# Altium schematic symbol library AliPadash.SchLib: 1186 symbols (part 1 of 6)
Pins are listed as number, name and electrical type; pins without a type are passive.

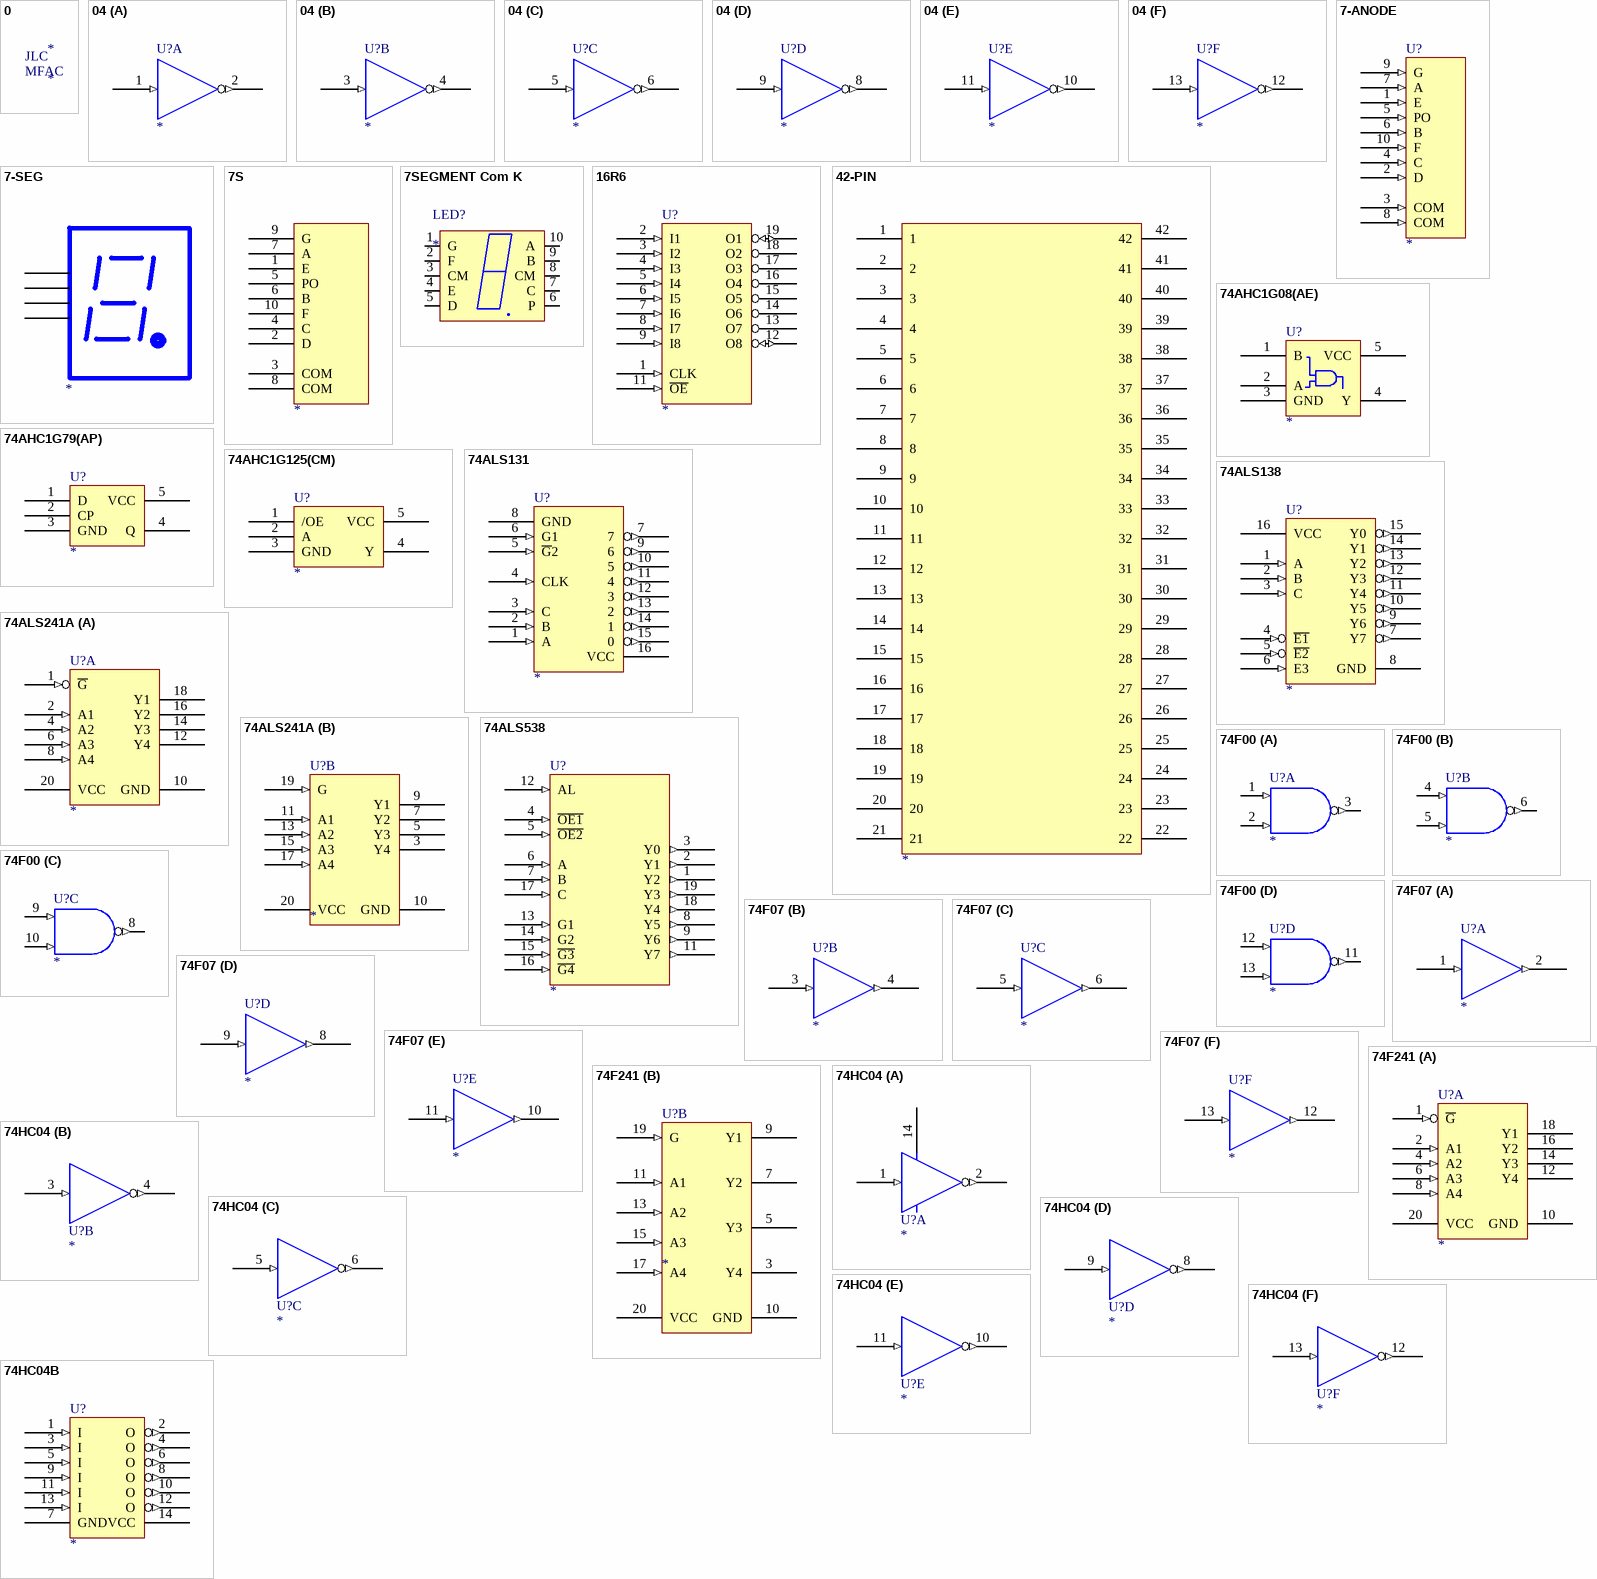
[diagram p0: symbols 0 to 74HC04B]

## 0
designator *
text: JLC; MFAC

## 04
designator U?
footprint SO-14
footprint DIP14
part A pins: 1 I (in), 2 O (out), 7 GND (power) hidden to GND, 14 VCC (power) hidden to VCC
part B pins: 3 I (in), 4 O (out), 7 GND (power) hidden to GND, 14 VCC (power) hidden to VCC
part C pins: 5 I (in), 6 O (out), 7 GND (power) hidden to GND, 14 VCC (power) hidden to VCC
part D pins: 7 GND (power) hidden to GND, 8 O (out), 9 I (in), 14 VCC (power) hidden to VCC
part E pins: 7 GND (power) hidden to GND, 10 O (out), 11 I (in), 14 VCC (power) hidden to VCC
part F pins: 7 GND (power) hidden to GND, 12 O (out), 13 I (in), 14 VCC (power) hidden to VCC
1 alternate drawing of the same symbol

## 7-ANODE
designator U?
pins: 1 E (in), 2 D (in), 3 COM (in), 4 C (in), 5 PO (in), 6 B (in), 7 A (in), 8 COM (in), 9 G (in), 10 F (in)

## 7-SEG
designator ?
pins: ?1, ?2, ?3, ?4

## 7S
designator ?
SS?
pins: 1 E, 2 D, 3 COM, 4 C, 5 PO, 6 B, 7 A, 8 COM, 9 G, 10 F

## 7SEGMENT Com K
designator LED?
ManufacturerName: SM420391N/8; JLCPCB: C252199
footprint 7SEGMENT
pins: 1 G, 2 F, 3 CM, 4 E, 5 D, 6 P, 7 C, 8 CM, 9 B, 10 A

## 16R6
designator U?
footprint DIP20
pins: 1 CLK (in), 2 I1 (in), 3 I2 (in), 4 I3 (in), 5 I4 (in), 6 I5 (in), 7 I6 (in), 8 I7 (in), 9 I8 (in), 10 GND (power) hidden to GND, 11 ~{OE} (in), 12 O8 (io), 13 O7 (hiz), 14 O6 (hiz), 15 O5 (hiz), 16 O4 (hiz), 17 O3 (hiz), 18 O2 (hiz), 19 O1 (io), 20 VCC (power) hidden to VCC

## 42-PIN
designator ?
pins: 1, 2, 3, 4, 5, 6, 7, 8, 9, 10, 11, 12, 13, 14, 15, 16, 17, 18, 19, 20, 21, 22, 23, 24, 25, 26, 27, 28, 29, 30, 31, 32, 33, 34, 35, 36, 37, 38, 39, 40, 41, 42

## 74AHC1G08(AE)
designator U?
footprint SOT353
pins: 1 B, 2 A, 3 GND, 4 Y, 5 VCC

## 74AHC1G79(AP)
designator U?
footprint SOT353
pins: 1 D, 2 CP, 3 GND, 4 Q, 5 VCC

## 74AHC1G125(CM)
designator U?
footprint SOT353
pins: 1 /OE, 2 A, 3 GND, 4 Y, 5 VCC

## 74ALS131
designator U?
footprint DIP16
pins: 1 A (in), 2 B (in), 3 C (in), 4 CLK (in), 5 ~{G}2 (in), 6 G1 (in), 7 (out), 8 GND (power), 9 6 (out), 10 5 (out), 11 4 (out), 12 3 (out), 13 2 (out), 14 1 (out), 15 0 (out), 16 VCC (power)

## 74ALS138
designator U?
footprint DIP16
pins: 1 A (in), 2 B (in), 3 C (in), 4 ~{E1} (in), 5 ~{E2} (in), 6 E3 (in), 7 Y7 (out), 8 GND (power), 9 Y6 (out), 10 Y5 (out), 11 Y4 (out), 12 Y3 (out), 13 Y2 (out), 14 Y1 (out), 15 Y0 (out), 16 VCC (power)

## 74ALS241A
designator U?
OCTAL BUF AND LIN DRV 3SO
footprint DIP20
footprint SOICW20
part A pins: 1 ~{G} (in), 2 A1 (in), 4 A2 (in), 6 A3 (in), 8 A4 (in), 10 GND (power), 12 Y4 (hiz), 14 Y3 (hiz), 16 Y2 (hiz), 18 Y1 (hiz), 20 VCC (power)
part B pins: 3 Y4 (hiz), 5 Y3 (hiz), 7 Y2 (hiz), 9 Y1 (hiz), 10 GND (power), 11 A1 (in), 13 A2 (in), 15 A3 (in), 17 A4 (in), 19 G (in), 20 VCC (power)
1 alternate drawing of the same symbol

## 74ALS538
designator U?
footprint DIP20
pins: 1 Y2 (out), 2 Y1 (out), 3 Y0 (out), 4 ~{OE1} (in), 5 ~{OE2} (in), 6 A (in), 7 B (in), 8 Y5 (out), 9 Y6 (out), 10 GND (power) hidden to GND, 11 Y7 (out), 12 AL (in), 13 G1 (in), 14 G2 (in), 15 ~{G3} (in), 16 ~{G4} (in), 17 C (in), 18 Y4 (out), 19 Y3 (out), 20 VCC (power) hidden to VCC

## 74F00
designator U?
Quad 2-Input Positive-NAND Gate
footprint DIP-14
simulation model 74F00 (SIMCODE)
part A pins: 1 A (in), 2 B (in), 3 Y (out), 7 GND (power) hidden to GND, 14 VCC (power) hidden to VCC
part B pins: 4 A (in), 5 B (in), 6 Y (out), 7 GND (power) hidden to GND, 14 VCC (power) hidden to VCC
part C pins: 7 GND (power) hidden to GND, 8 Y (out), 9 A (in), 10 B (in), 14 VCC (power) hidden to VCC
part D pins: 7 GND (power) hidden to GND, 11 Y (out), 12 A (in), 13 B (in), 14 VCC (power) hidden to VCC
1 alternate drawing of the same symbol

## 74F07
designator U?
footprint SO-14
part A pins: 1 I (in), 2 O (out), 7 GND hidden to GND, 14 VCC hidden to VCC
part B pins: 3 I (in), 4 O (out), 7 GND hidden to GND, 14 VCC hidden to VCC
part C pins: 5 I (in), 6 O (out), 7 GND hidden to GND, 14 VCC hidden to VCC
part D pins: 7 GND hidden to GND, 8 O (out), 9 I (in), 14 VCC hidden to VCC
part E pins: 7 GND hidden to GND, 10 O (out), 11 I (in), 14 VCC hidden to VCC
part F pins: 7 GND hidden to GND, 12 O (out), 13 I (in), 14 VCC hidden to VCC

## 74F241
designator U?
OCTAL BUF AND LIN DRV 3SO
footprint SOICW20
footprint DIP20
part A pins: 1 ~{G} (in), 2 A1 (in), 4 A2 (in), 6 A3 (in), 8 A4 (in), 10 GND (power), 12 Y4 (hiz), 14 Y3 (hiz), 16 Y2 (hiz), 18 Y1 (hiz), 20 VCC (power)
part B pins: 3 Y4 (hiz), 5 Y3 (hiz), 7 Y2 (hiz), 9 Y1 (hiz), 10 GND (power), 11 A1 (in), 13 A2 (in), 15 A3 (in), 17 A4 (in), 19 G (in), 20 VCC (power)
1 alternate drawing of the same symbol

## 74HC04
designator U?
footprint DIP14
part A pins: 1 I (in), 2 O (out), 7 GND (power) hidden to GND, 14 VCC (power)
part B pins: 3 I (in), 4 O (out), 7 GND (power) hidden to GND, 14 VCC (power) hidden to VCC
part C pins: 5 I (in), 6 O (out), 7 GND (power) hidden to GND, 14 VCC (power) hidden to VCC
part D pins: 7 GND (power) hidden to GND, 8 O (out), 9 I (in), 14 VCC (power) hidden to VCC
part E pins: 7 GND (power) hidden to GND, 10 O (out), 11 I (in), 14 VCC (power) hidden to VCC
part F pins: 7 GND (power) hidden to GND, 12 O (out), 13 I (in), 14 VCC (power) hidden to VCC
1 alternate drawing of the same symbol

## 74HC04B
designator U?
footprint SO-14
pins: 1 I (in), 2 O (out), 3 I (in), 4 O (out), 5 I (in), 6 O (out), 7 GND (power), 8 O (out), 9 I (in), 10 O (out), 11 I (in), 12 O (out), 13 I (in), 14 VCC (power)
1 alternate drawing of the same symbol

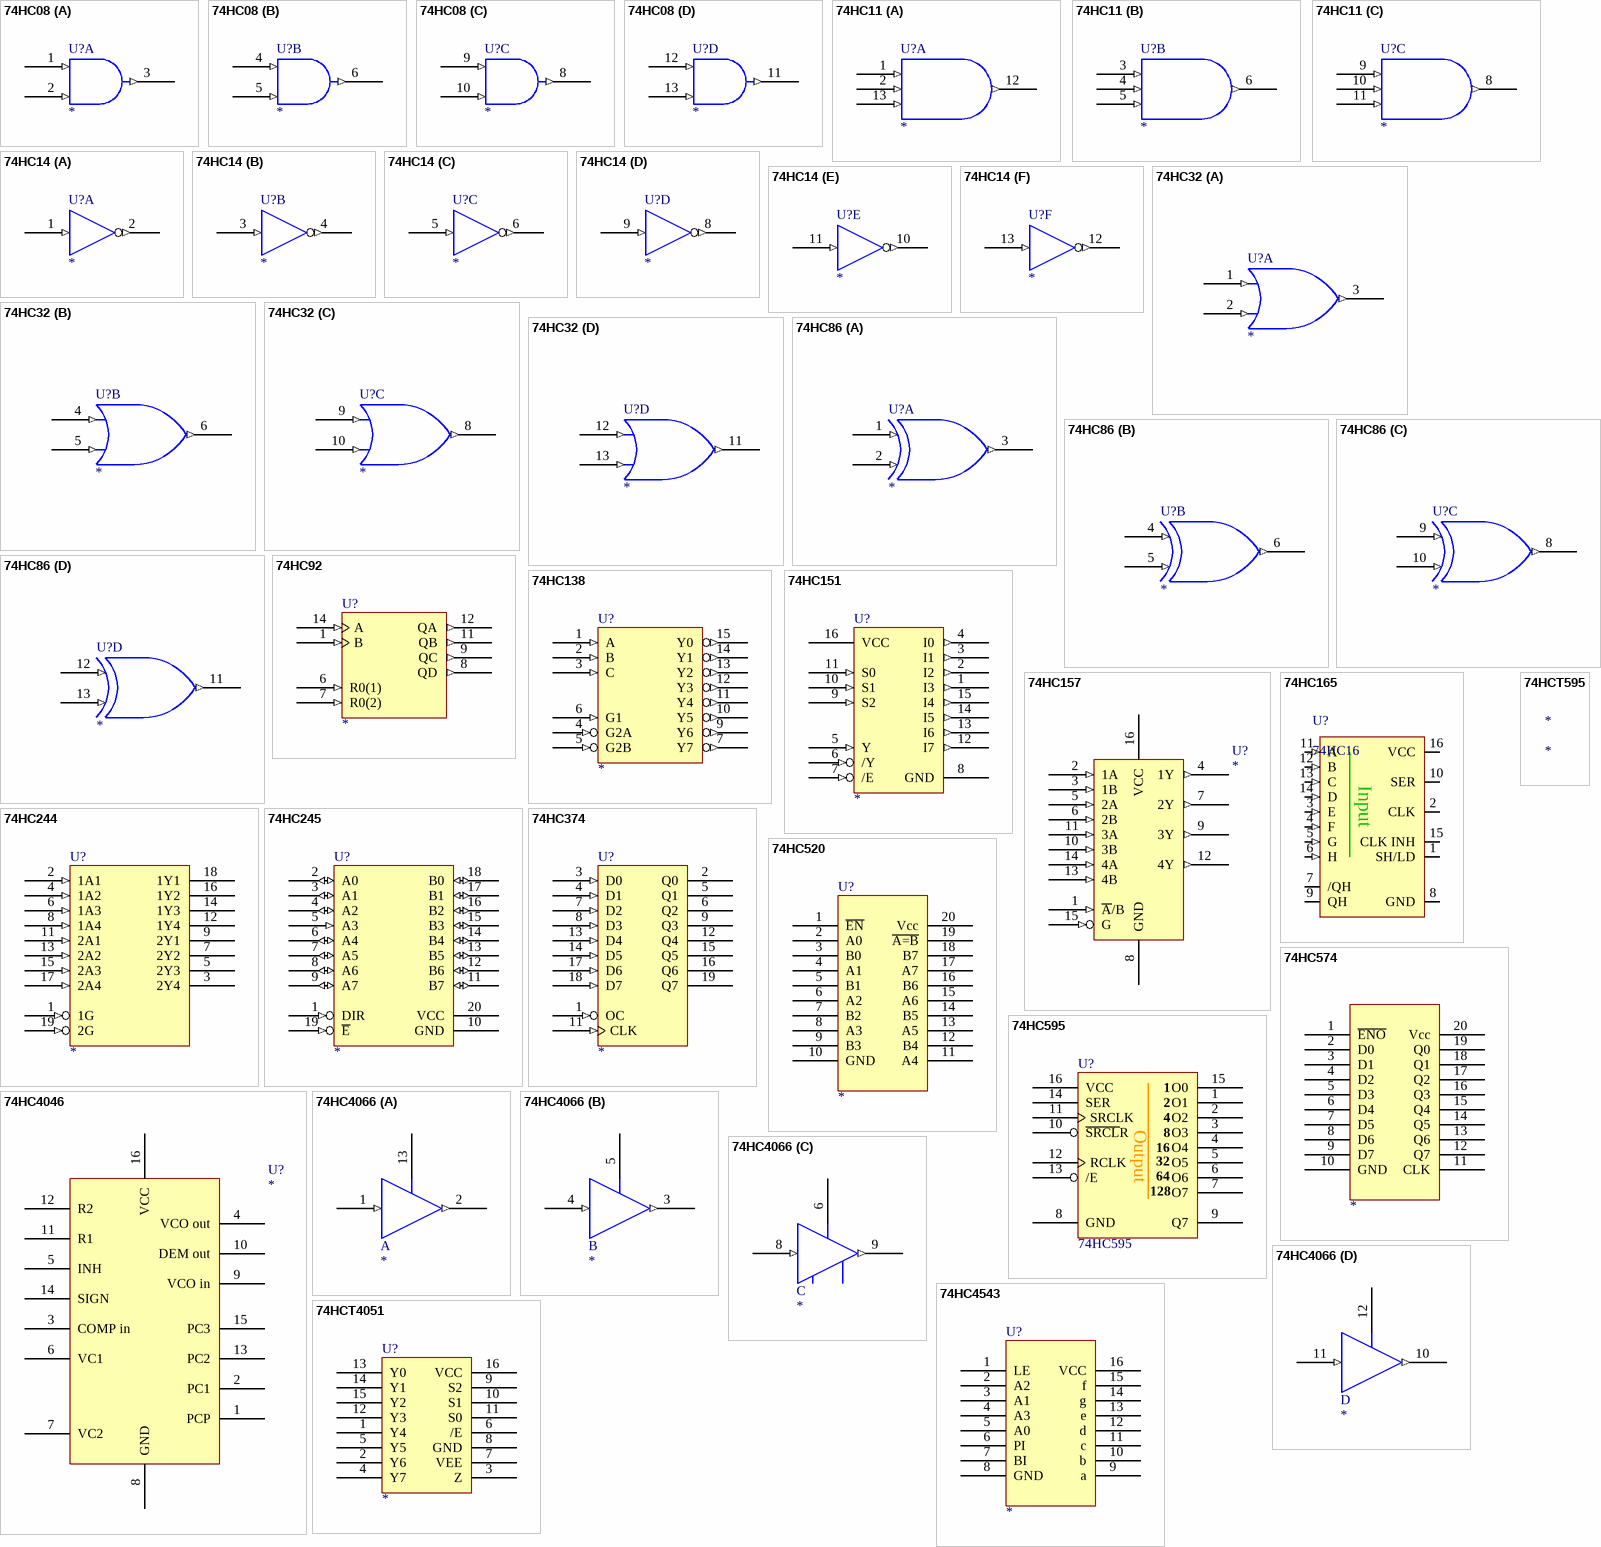
[diagram p1: symbols 74HC08 to 74HCT4051]

## 74HC08
designator U?
part A pins: 1 I0 (in), 2 I1 (in), 3 O (out), 7 GND (power) hidden to GND, 14 VCC (power) hidden to VCC
part B pins: 4 I0 (in), 5 I1 (in), 6 O (out), 7 GND (power) hidden to GND, 14 VCC (power) hidden to VCC
part C pins: 7 GND (power) hidden to GND, 8 O (out), 9 I0 (in), 10 I1 (in), 14 VCC (power) hidden to VCC
part D pins: 7 GND (power) hidden to GND, 11 O (out), 12 I0 (in), 13 I1 (in), 14 VCC (power) hidden to VCC
1 alternate drawing of the same symbol

## 74HC11
designator U?
part A pins: 1 I0 (in), 2 I1 (in), 7 GND (power) hidden to GND, 12 O (out), 13 I2 (in), 14 VCC (power) hidden to VCC
part B pins: 3 I0 (in), 4 I1 (in), 5 I2 (in), 6 O (out), 7 GND (power) hidden to GND, 14 VCC (power) hidden to VCC
part C pins: 7 GND (power) hidden to GND, 8 O (out), 9 I0 (in), 10 I1 (in), 11 I2 (in), 14 VCC (power) hidden to VCC
1 alternate drawing of the same symbol

## 74HC14
designator U?
footprint DIP14
part A pins: 1 I (in), 2 O (out), 7 GND (power) hidden to GND, 14 VCC (power) hidden to VCC
part B pins: 3 I (in), 4 O (out), 7 GND (power) hidden to GND, 14 VCC (power) hidden to VCC
part C pins: 5 I (in), 6 O (out), 7 GND (power) hidden to GND, 14 VCC (power) hidden to VCC
part D pins: 7 GND (power) hidden to GND, 8 O (out), 9 I (in), 14 VCC (power) hidden to VCC
part E pins: 7 GND (power) hidden to GND, 10 O (out), 11 I (in), 14 VCC (power) hidden to VCC
part F pins: 7 GND (power) hidden to GND, 12 O (out), 13 I (in), 14 VCC (power) hidden to VCC
1 alternate drawing of the same symbol

## 74HC32
designator U?
part A pins: 1 I0 (in), 2 I1 (in), 3 O (out), 7 GND (power) hidden to GND, 14 VCC (power) hidden to VCC
part B pins: 4 I0 (in), 5 I1 (in), 6 O (out), 7 GND (power) hidden to GND, 14 VCC (power) hidden to VCC
part C pins: 7 GND (power) hidden to GND, 8 O (out), 9 I0 (in), 10 I1 (in), 14 VCC (power) hidden to VCC
part D pins: 7 GND (power) hidden to GND, 11 O (out), 12 I0 (in), 13 I1 (in), 14 VCC (power) hidden to VCC
1 alternate drawing of the same symbol

## 74HC86
designator U?
part A pins: 1 I0 (in), 2 I1 (in), 3 O (out), 7 GND (power) hidden to GND, 14 VCC (power) hidden to VCC
part B pins: 4 I0 (in), 5 I1 (in), 6 O (out), 7 GND (power) hidden to GND, 14 VCC (power) hidden to VCC
part C pins: 7 GND (power) hidden to GND, 8 O (out), 9 I0 (in), 10 I1 (in), 14 VCC (power) hidden to VCC
part D pins: 7 GND (power) hidden to GND, 11 O (out), 12 I0 (in), 13 I1 (in), 14 VCC (power) hidden to VCC
1 alternate drawing of the same symbol

## 74HC92
designator U?
pins: 1 B (in), 5 VCC (power) hidden to VCC, 6 R0(1) (in), 7 R0(2) (in), 8 QD (out), 9 QC (out), 10 GND (power) hidden to GND, 11 QB (out), 12 QA (out), 14 A (in)

## 74HC138
designator U?
pins: 1 A (in), 2 B (in), 3 C (in), 4 G2A (in), 5 G2B (in), 6 G1 (in), 7 Y7 (out), 8 GND (power) hidden to GND, 9 Y6 (out), 10 Y5 (out), 11 Y4 (out), 12 Y3 (out), 13 Y2 (out), 14 Y1 (out), 15 Y0 (out), 16 VCC (power) hidden to VCC

## 74HC151
designator U?
footprint SO-16
pins: 1 I3 (out), 2 I2 (out), 3 I1 (out), 4 I0 (out), 5 Y (in), 6 /Y (in), 7 /E (in), 8 GND (power), 9 S2 (in), 10 S1 (in), 11 S0 (in), 12 I7 (out), 13 I6 (out), 14 I5 (out), 15 I4 (out), 16 VCC (power)

## 74HC157
designator U?
pins: 1 ~{A}/B (in), 2 1A (in), 3 1B (in), 4 1Y (out), 5 2A (in), 6 2B (in), 7 2Y (out), 8 GND (power), 9 3Y (out), 10 3B (in), 11 3A (in), 12 4Y (out), 13 4B (in), 14 4A (in), 15 G (in), 16 VCC (power)

## 74HC165
designator U?, comment 74HC16
MFC: 74HC165D,653; JLC: C5613
footprint SO-16
pins: 1 SH/LD, 2 CLK, 3 E (in), 4 F (in), 5 G (in), 6 H (in), 7 /QH, 8 GND, 9 QH, 10 SER, 11 A (in), 12 B (in), 13 C (in), 14 D (in), 15 CLK INH, 16 VCC
text: Input

## 74HC244
designator U?
pins: 1 1G (in), 2 1A1 (in), 3 2Y4 (hiz), 4 1A2 (in), 5 2Y3 (hiz), 6 1A3 (in), 7 2Y2 (hiz), 8 1A4 (in), 9 2Y1 (hiz), 10 GND (power) hidden to GND, 11 2A1 (in), 12 1Y4 (hiz), 13 2A2 (in), 14 1Y3 (hiz), 15 2A3 (in), 16 1Y2 (hiz), 17 2A4 (in), 18 1Y1 (hiz), 19 2G (in), 20 VCC (power) hidden to VCC

## 74HC245
designator U?
pins: 1 DIR (in), 2 A0 (io), 3 A1 (io), 4 A2 (io), 5 A3 (in), 6 A4 (io), 7 A5 (io), 8 A6 (io), 9 A7 (io), 10 GND, 11 B7 (io), 12 B6 (io), 13 B5 (io), 14 B4 (io), 15 B3 (io), 16 B2 (io), 17 B1 (io), 18 B0 (io), 19 ~{E} (in), 20 VCC

## 74HC374
designator U?
pins: 1 OC (in), 2 Q0 (hiz), 3 D0 (in), 4 D1 (in), 5 Q1 (hiz), 6 Q2 (hiz), 7 D2 (in), 8 D3 (in), 9 Q3 (hiz), 10 GND (power) hidden to GND, 11 CLK (in), 12 Q4 (hiz), 13 D4 (in), 14 D5 (in), 15 Q5 (hiz), 16 Q6 (hiz), 17 D6 (in), 18 D7 (in), 19 Q7 (hiz), 20 VCC (power) hidden to VCC

## 74HC520
designator U?
pins: 1 ~{EN}, 2 A0, 3 B0, 4 A1, 5 B1, 6 A2, 7 B2, 8 A3, 9 B3, 10 GND, 11 A4, 12 B4, 13 A5, 14 B5, 15 A6, 16 B6, 17 A7, 18 B7, 19 ~{A=B}, 20 Vcc

## 74HC574
designator ?
pins: 1 ~{ENO}, 2 D0, 3 D1, 4 D2, 5 D3, 6 D4, 7 D5, 8 D6, 9 D7, 10 GND, 11 CLK, 12 Q7, 13 Q6, 14 Q5, 15 Q4, 16 Q3, 17 Q2, 18 Q1, 19 Q0, 20 Vcc

## 74HC595
designator U?
MFAC: 74HC595D,118; JLC: C5947
footprint SO-16
pins: 1 O1, 2 O2, 3 O3, 4 O4, 5 O5, 6 O6, 7 O7, 8 GND, 9 Q7, 10 ~{SRCL}R, 11 SRCLK, 12 RCLK, 13 /E, 14 SER, 15 O0, 16 VCC
text: Output; 32; 64; 128

## 74HC4046
designator U?
footprint DIP16
pins: 1 PCP, 2 PC1, 3 COMP in, 4 VCO out, 5 INH, 6 VC1, 7 VC2, 8 GND (power), 9 VCO in, 10 DEM out, 11 R1, 12 R2, 13 PC2, 14 SIGN, 15 PC3, 16 VCC (power)

## 74HC4066
designator ?
part A pins: 1 I (in), 2 O (out), 7 GND hidden to GND, 13 X1, 14 VCC hidden to VCC
part B pins: 3 O (out), 4 I (in), 5, 7 GND hidden to GND, 14 VCC hidden to VCC
part C pins: 6, 7 hidden, 8 (in), 9 (out), 14 hidden
part D pins: 7 GND hidden to GND, 10 O (out), 11 I (in), 12, 14 VCC hidden to VCC

## 74HC4543
designator U?
pins: 1 LE, 2 A2, 3 A1, 4 A3, 5 A0, 6 PI, 7 BI, 8 GND (power), 9 a, 10 b, 11 c, 12 d, 13 e, 14 g, 15 f, 16 VCC (power)

## 74HCT595
designator *

## 74HCT4051
designator U?
footprint SO-16
pins: 1 Y4, 2 Y6, 3 Z, 4 Y7, 5 Y5, 6 /E, 7 VEE, 8 GND, 9 S2, 10 S1, 11 S0, 12 Y3, 13 Y0, 14 Y1, 15 Y2, 16 VCC

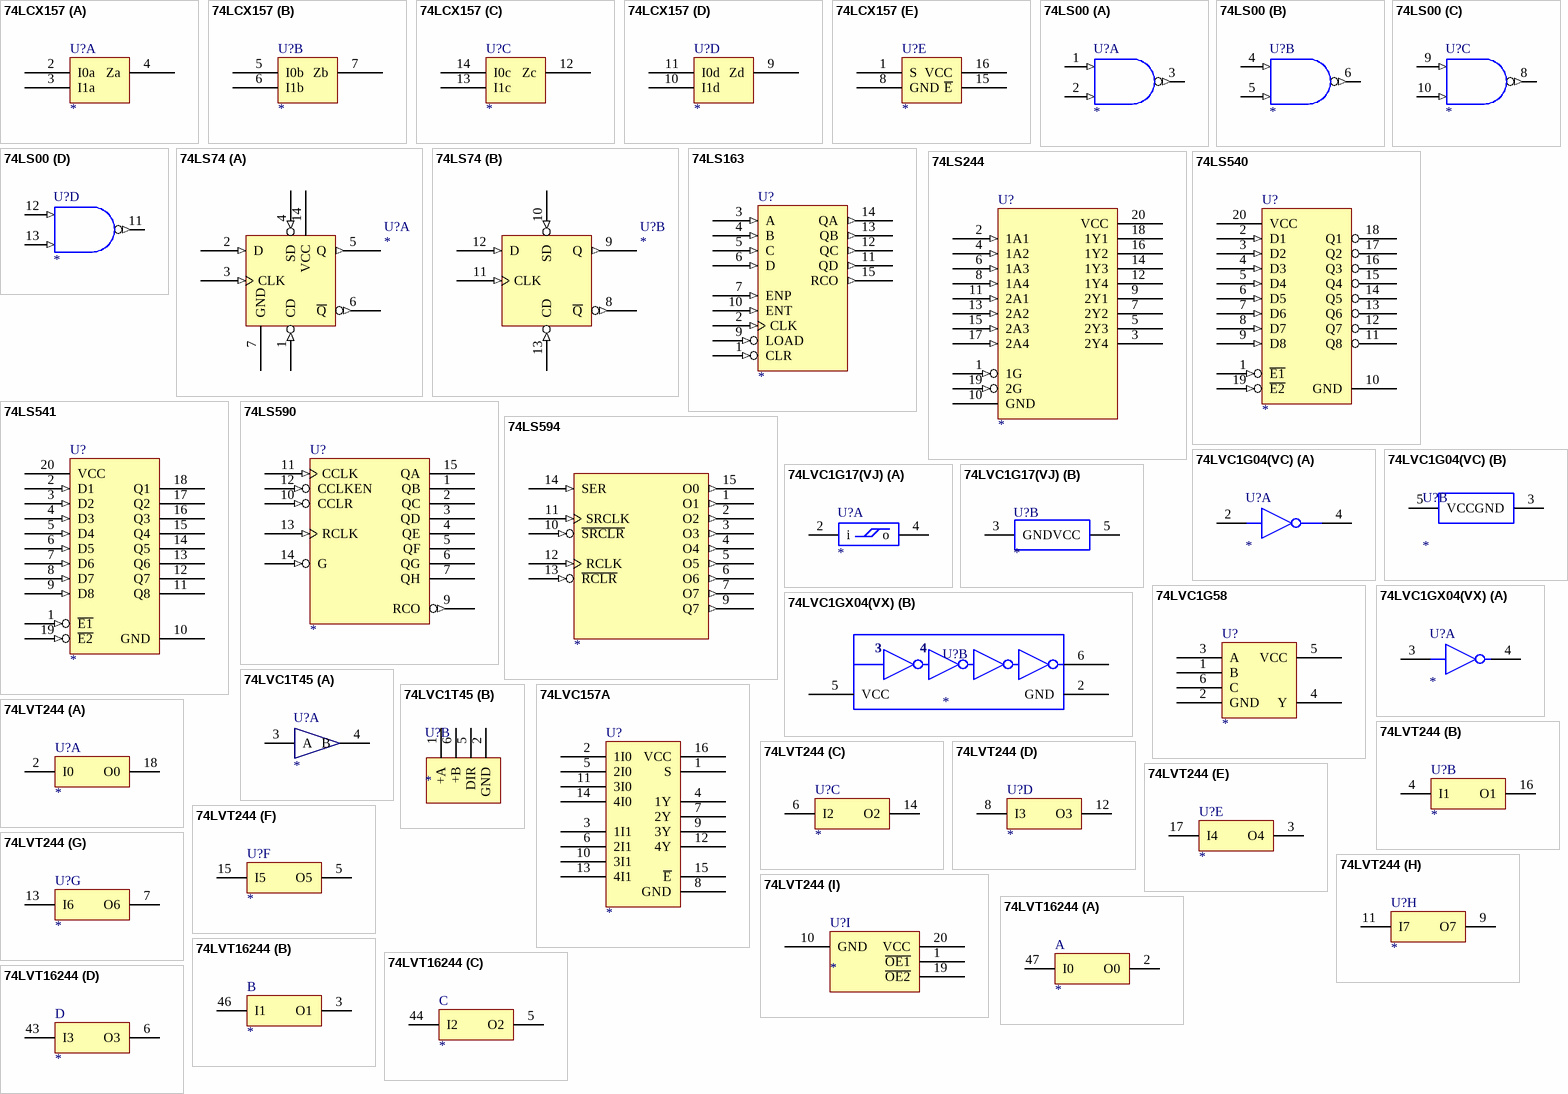
[diagram p2: symbols 74LCX157 to 74LVT16244]

## 74LCX157
designator U?
part A pins: 2 I0a, 3 I1a, 4 Za
part B pins: 5 I0b, 6 I1b, 7 Zb
part C pins: 12 Zc, 13 I1c, 14 I0c
part D pins: 9 Zd, 10 I1d, 11 I0d
part E pins: 1 S, 8 GND, 15 ~{E}, 16 VCC

## 74LS00
designator U?
Quad 2-Input Positive-NAND Gate
footprint DIP-14
simulation model 74LS00 (SIMCODE)
part A pins: 1 A (in), 2 B (in), 3 Y (out), 7 GND (power) hidden to GND, 14 VCC (power) hidden to VCC
part B pins: 4 A (in), 5 B (in), 6 Y (out), 7 GND (power) hidden to GND, 14 VCC (power) hidden to VCC
part C pins: 7 GND (power) hidden to GND, 8 Y (out), 9 A (in), 10 B (in), 14 VCC (power) hidden to VCC
part D pins: 7 GND (power) hidden to GND, 11 Y (out), 12 A (in), 13 B (in), 14 VCC (power) hidden to VCC
1 alternate drawing of the same symbol

## 74LS74
designator U?
footprint DIP14
part A pins: 1 CD (in), 2 D (in), 3 CLK (in), 4 SD (in), 5 Q (out), 6 ~{Q} (out), 7 GND (power), 14 VCC (power)
part B pins: 7 GND (power) hidden to GND, 8 ~{Q} (out), 9 Q (out), 10 SD (in), 11 CLK (in), 12 D (in), 13 CD (in), 14 VCC (power) hidden to VCC

## 74LS163
designator U?
pins: 1 CLR (in), 2 CLK (in), 3 A (in), 4 B (in), 5 C (in), 6 D (in), 7 ENP (in), 8 GND (power) hidden to GND, 9 LOAD (in), 10 ENT (in), 11 QD (out), 12 QC (out), 13 QB (out), 14 QA (out), 15 RCO (out), 16 VCC (power) hidden to VCC

## 74LS244
designator U?
footprint SO-20WB
pins: 1 1G (in), 2 1A1 (in), 3 2Y4 (hiz), 4 1A2 (in), 5 2Y3 (hiz), 6 1A3 (in), 7 2Y2 (hiz), 8 1A4 (in), 9 2Y1 (hiz), 10 GND (power), 11 2A1 (in), 12 1Y4 (hiz), 13 2A2 (in), 14 1Y3 (hiz), 15 2A3 (in), 16 1Y2 (hiz), 17 2A4 (in), 18 1Y1 (hiz), 19 2G (in), 20 VCC (power)

## 74LS540
designator U?
footprint DIP20
pins: 1 ~{E1} (in), 2 D1 (in), 3 D2 (in), 4 D3 (in), 5 D4 (in), 6 D5 (in), 7 D6 (in), 8 D7 (in), 9 D8 (in), 10 GND (power), 11 Q8 (hiz), 12 Q7 (hiz), 13 Q6 (hiz), 14 Q5 (hiz), 15 Q4 (hiz), 16 Q3 (hiz), 17 Q2 (hiz), 18 Q1 (hiz), 19 ~{E2} (in), 20 VCC (power)

## 74LS541
designator U?
footprint DIP20
pins: 1 ~{E1} (in), 2 D1 (in), 3 D2 (in), 4 D3 (in), 5 D4 (in), 6 D5 (in), 7 D6 (in), 8 D7 (in), 9 D8 (in), 10 GND (power), 11 Q8 (hiz), 12 Q7 (hiz), 13 Q6 (hiz), 14 Q5 (hiz), 15 Q4 (hiz), 16 Q3 (hiz), 17 Q2 (hiz), 18 Q1 (hiz), 19 ~{E2} (in), 20 VCC (power)

## 74LS590
designator U?
pins: 1 QB (hiz), 2 QC (hiz), 3 QD (hiz), 4 QE (hiz), 5 QF (hiz), 6 QG (hiz), 7 QH (hiz), 8 GND (power) hidden to GND, 9 RCO (out), 10 CCLR (in), 11 CCLK (in), 12 CCLKEN (in), 13 RCLK (in), 14 G (in), 15 QA (hiz), 16 VCC (power) hidden to VCC

## 74LS594
designator ?
pins: 1 O1 (out), 2 O2 (out), 3 O3 (out), 4 O4 (out), 5 O5 (out), 6 O6 (out), 7 O7 (out), 9 Q7 (out), 10 ~{SRCLR} (in), 11 SRCLK (in), 12 RCLK (in), 13 ~{RCLR} (in), 14 SER (in), 15 O0 (out)

## 74LVC1G04(VC)
designator U?
footprint SOT353
part A pins: 2, 4
part B pins: 3 GND, 5 VCC

## 74LVC1G17(VJ)
designator U?
footprint SOT353
part A pins: 2 i, 4 o
part B pins: 3 GND, 5 VCC

## 74LVC1G58
designator U?
footprint SOT363
pins: 1 B, 2 GND, 3 A, 4 Y, 5 VCC, 6 C

## 74LVC1GX04(VX)
designator U?
footprint SOT363
part A pins: 3, 4
part B pins: 2 GND, 5 VCC, 6

## 74LVC1T45
designator U?
footprint SOT363
part A pins: 3 A, 4 B
part B pins: 1 +A, 2 GND, 5 DIR, 6 +B

## 74LVC157A
designator U?
footprint SO-16
pins: 1 S, 2 1I0, 3 1I1, 4 1Y, 5 2I0, 6 2I1, 7 2Y, 8 GND, 9 3Y, 10 3I1, 11 3I0, 12 4Y, 13 4I1, 14 4I0, 15 ~{E}, 16 VCC

## 74LVT244
designator U?
footprint M20B
part A pins: 2 I0, 18 O0
part B pins: 4 I1, 16 O1
part C pins: 6 I2, 14 O2
part D pins: 8 I3, 12 O3
part E pins: 3 O4, 17 I4
part F pins: 5 O5, 15 I5
part G pins: 7 O6, 13 I6
part H pins: 9 O7, 11 I7
part I pins: 1 ~{OE1}, 10 GND, 19 ~{OE2}, 20 VCC

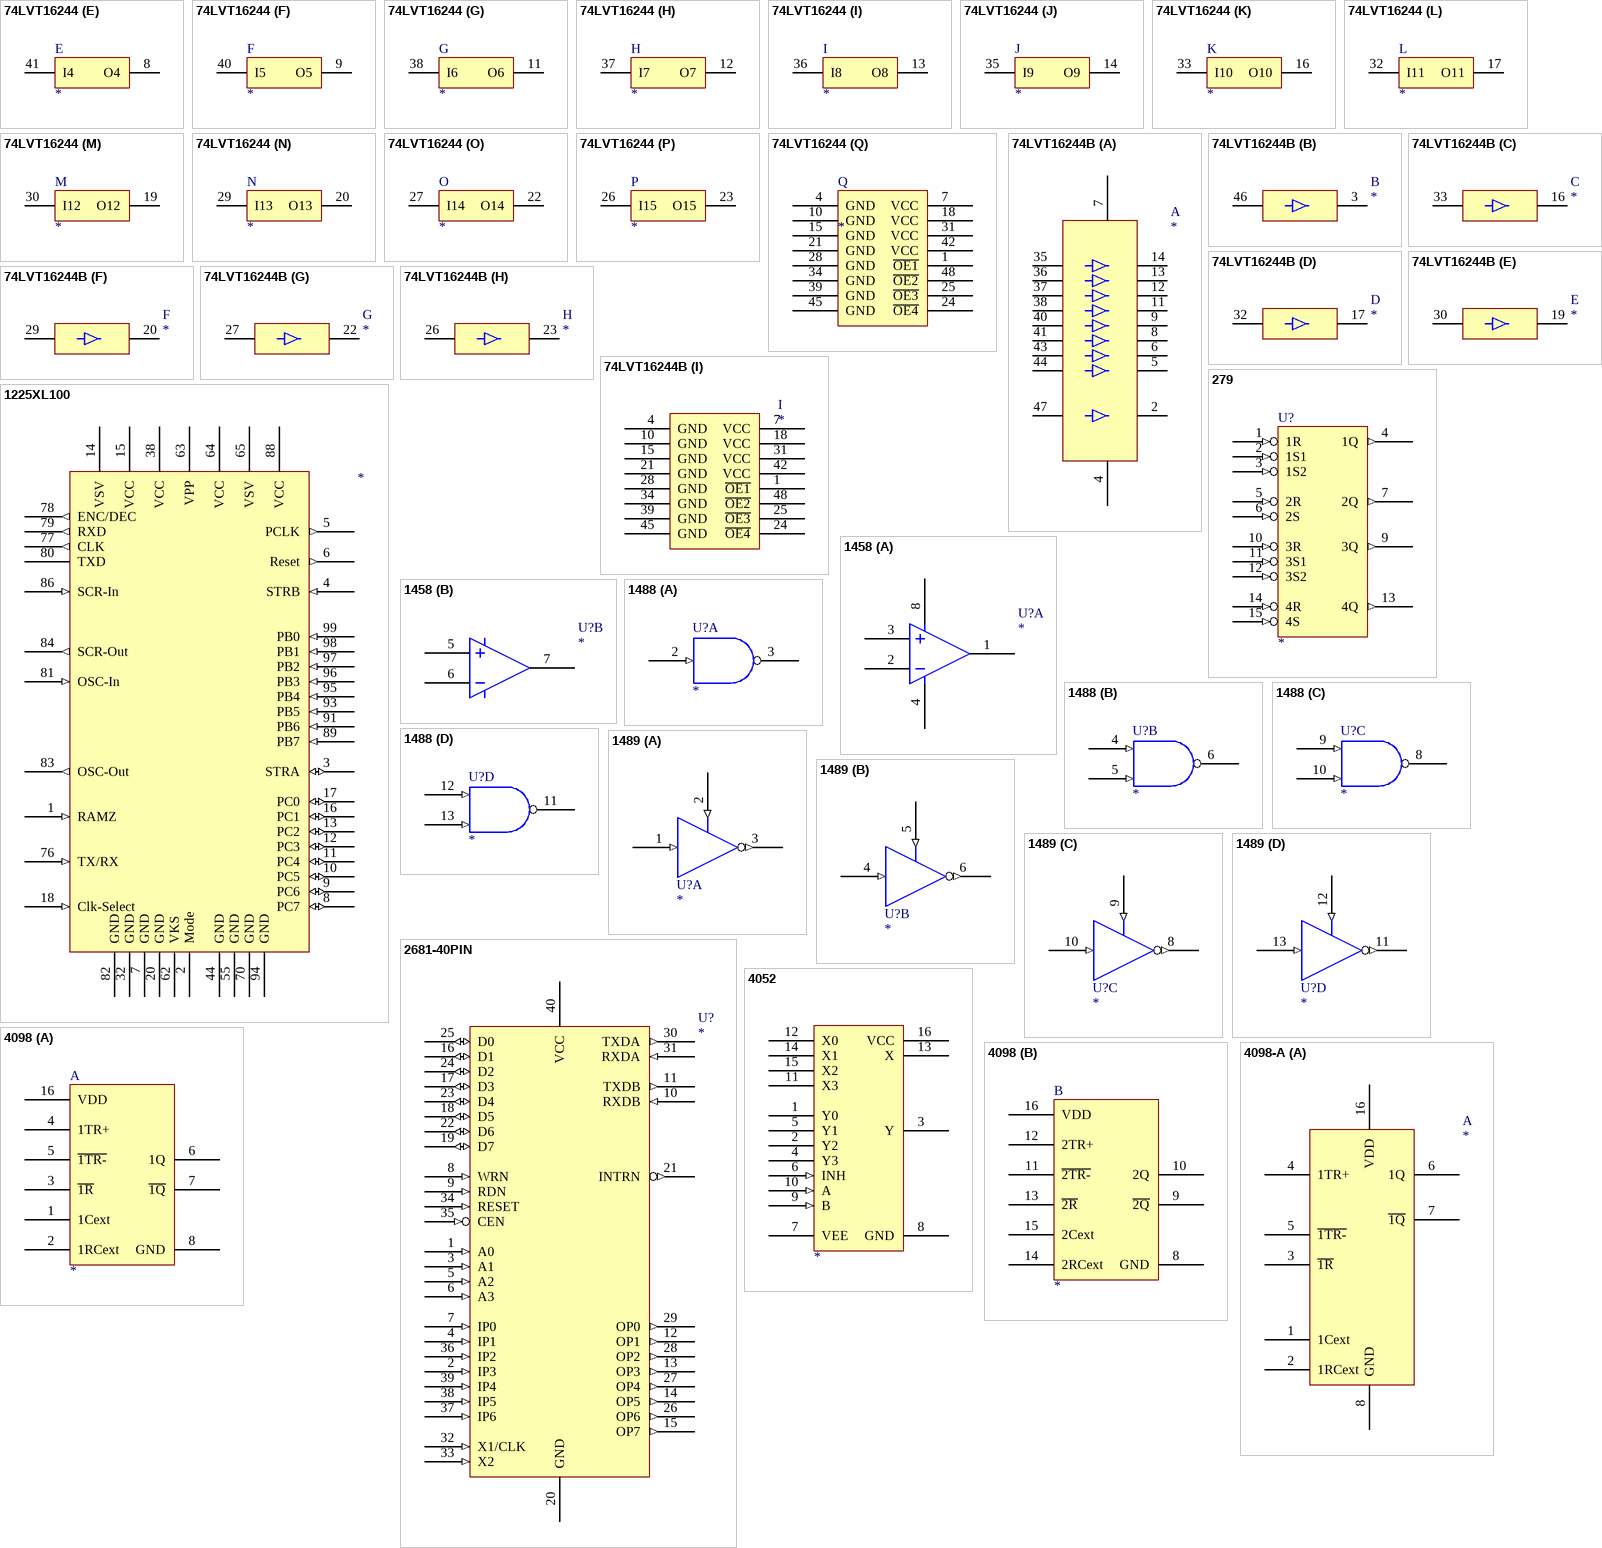
[diagram p3: symbols 74LVT16244 to 4098-A]

## 74LVT16244
designator ?
footprint MS48A
part A pins: 2 O0, 47 I0
part B pins: 3 O1, 46 I1
part C pins: 5 O2, 44 I2
part D pins: 6 O3, 43 I3
part E pins: 8 O4, 41 I4
part F pins: 9 O5, 40 I5
part G pins: 11 O6, 38 I6
part H pins: 12 O7, 37 I7
part I pins: 13 O8, 36 I8
part J pins: 14 O9, 35 I9
part K pins: 16 O10, 33 I10
part L pins: 17 O11, 32 I11
part M pins: 19 O12, 30 I12
part N pins: 20 O13, 29 I13
part O pins: 22 O14, 27 I14
part P pins: 23 O15, 26 I15
part Q pins: 1 ~{OE1}, 4 GND, 7 VCC, 10 GND, 15 GND, 18 VCC, 21 GND, 24 ~{OE4}, 25 ~{OE3}, 28 GND, 31 VCC, 34 GND, 39 GND, 42 VCC, 45 GND, 48 ~{OE2}

## 74LVT16244B
designator ?
footprint MS48A
part A pins: 2 O0, 4 GND, 5 O2, 6 O3, 7 VCC, 8 O4, 9 O5, 11 O6, 12 O7, 13 O8, 14 O9, 35 I9, 36 I8, 37 I7, 38 I6, 40 I5, 41 I4, 43 I3, 44 I2, 47 I0
part B pins: 3 O1, 46 I1
part C pins: 16 O10, 33 I10
part D pins: 17 O11, 32 I11
part E pins: 19 O12, 30 I12
part F pins: 20 O13, 29 I13
part G pins: 22 O14, 27 I14
part H pins: 23 O15, 26 I15
part I pins: 1 ~{OE1}, 4 GND, 7 VCC, 10 GND, 15 GND, 18 VCC, 21 GND, 24 ~{OE4}, 25 ~{OE3}, 28 GND, 31 VCC, 34 GND, 39 GND, 42 VCC, 45 GND, 48 ~{OE2}

## 279
designator U?
pins: 1 1R (in), 2 1S1 (in), 3 1S2 (in), 4 1Q (out), 5 2R (in), 6 2S (in), 7 2Q (out), 8 GND (power) hidden to GND, 9 3Q (out), 10 3R (in), 11 3S1 (in), 12 3S2 (in), 13 4Q (out), 14 4R (in), 15 4S (in), 16 VCC (power) hidden to VCC

## 1225XL100
designator ?
U?
pins: 1 RAMZ (in), 2 Mode (power), 3 STRA (io), 4 STRB (in), 5 PCLK (out), 6 Reset (out), 7 GND (power), 8 PC7 (io), 9 PC6 (io), 10 PC5 (io), 11 PC4 (io), 12 PC3 (io), 13 PC2 (io), 14 VSV (power), 15 VCC (power), 16 PC1 (io), 17 PC0 (io), 18 Clk-Select (in), 20 GND (power), 32 GND (power), 38 VCC (power), 44 GND (power), 55 GND (power), 62 VKS (power), 63 VPP (power), 64 VCC (power), 65 VSV (power), 70 GND (power), 76 TX/RX (in), 77 CLK (out), 78 ENC/DEC (out), 79 RXD (out), 80 TXD, 81 OSC-In (in), 82 GND (power), 83 OSC-Out (out), 84 SCR-Out (out), 86 SCR-In (in), 88 VCC (power), 89 PB7 (in), 91 PB6 (in), 93 PB5 (in), 94 GND (power), 95 PB4 (in), 96 PB3 (in), 97 PB2 (in), 98 PB1 (in), 99 PB0 (in)

## 1458
designator U?
footprint DIP8
footprint SO-8
part A pins: 1, 2, 3, 4, 8
part B pins: 5, 6, 7
